# Altium footprint library TH_Connectors.PcbLib: 84 footprints (part 3 of 6)
Each footprint in its own frame and in the unit in brackets; x right, y up, seen from the top. Pads: shape width x height; smd on the part's side, far side on the other; paste and mask are expansions set on the pad; w line width, h text height; cw(c..) or ccw(c..) is an arc to the next point about the centre after c.
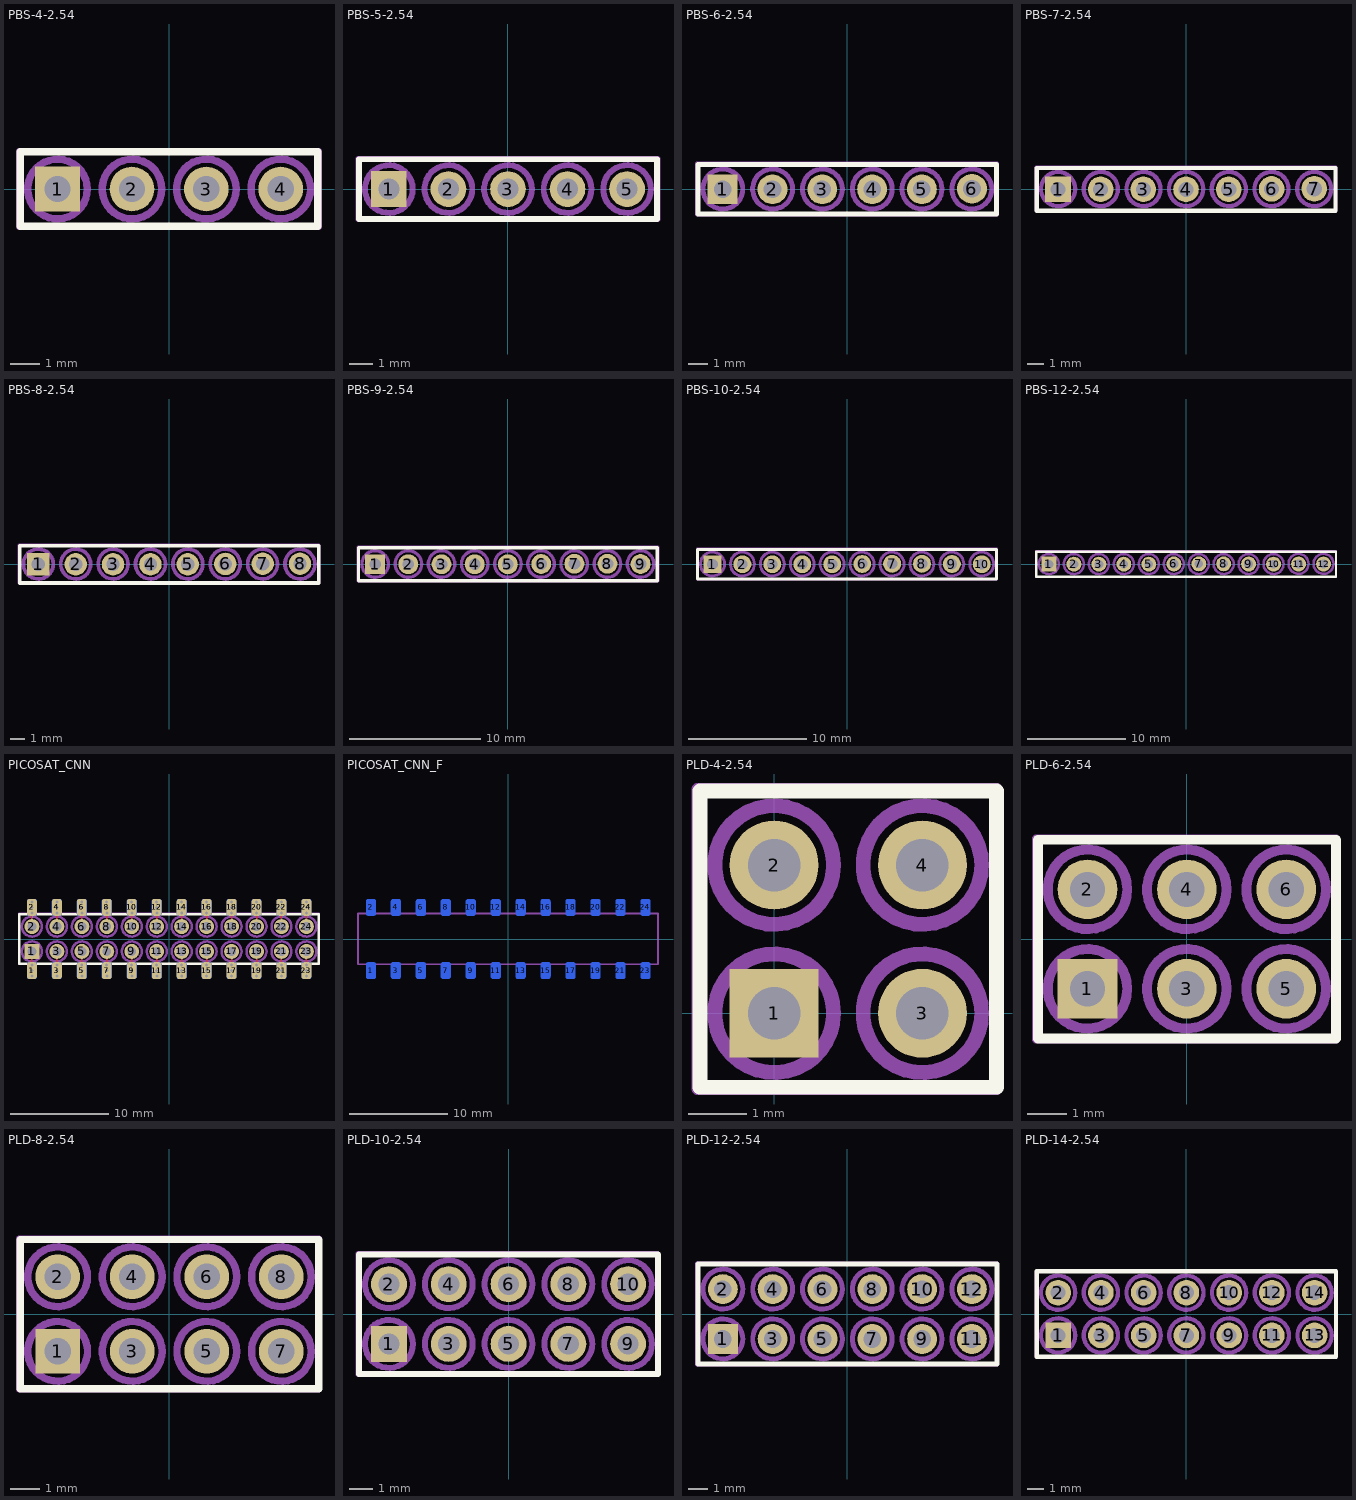
[diagram p2: the footprints below, top view; thin cyan lines are the x and y axes]

## PBS-4-2.54 [mil]
pads (4):
  rect 60x60 hole 35.43: 1(-150,0)
  round 60 hole 35.43: 2(-50,0) 3(50,0) 4(150,0)
Top Overlay:
  lines w10: -200,-50 -200,50 200,50 200,-50 -200,-50
Top Assembly:
  lines w7.87: -201.81,-51.12 -201.81,51.25 201.47,51.25 201.47,-51.12 -201.81,-51.12
Bottom Assembly:
  circle w10: c150,0 r40.05
  circle w10: c50,0 r40.05
  circle w10: c-50,0 r40.05
  circle w10: c-150,0 r40.05
3D body "User Library-PBS-01.STEP": height 330.71, standoff -125.98, extent 100,-50 200,50
3D body "User Library-PBS-01.STEP": height 330.71, standoff -125.98, extent 0,-50 100,50
3D body "User Library-PBS-01.STEP": height 330.71, standoff -125.98, extent -100,-50 0,50
3D body "User Library-PBS-01.STEP": height 330.71, standoff -125.98, extent -200,-50 -100,50

## PBS-5-2.54 [mil]
pads (5):
  rect 60x60 hole 35.43: 1(-200,0)
  round 60 hole 35.43: 2(-100,0) 3(0,0) 4(100,0) 5(200,0)
Top Overlay:
  lines w10: -250,-50 -250,50 250,50 250,-50 -250,-50
Top Assembly:
  lines w7.87: -251.81,-51.12 -251.81,51.25 251.9,51.25 251.9,-51.12 -251.81,-51.12
Bottom Assembly:
  circle w10: c0,0 r40.05
  circle w10: c200,0 r40.05
  circle w10: c100,0 r40.05
  circle w10: c-100,0 r40.05
  circle w10: c-200,0 r40.05
3D body "User Library-PBS-01.STEP": height 330.71, standoff -125.98, extent -250,-50 -150,50
3D body "User Library-PBS-01.STEP": height 330.71, standoff -125.98, extent -150,-49.99 -50,50.01
3D body "User Library-PBS-01.STEP": height 330.71, standoff -125.98, extent -50,-50 50,50
3D body "User Library-PBS-01.STEP": height 330.71, standoff -125.98, extent 50,-50 150,50
3D body "User Library-PBS-01.STEP": height 330.71, standoff -125.98, extent 150,-50 250,50

## PBS-6-2.54 [mil]
pads (6):
  rect 60x60 hole 35.43: 1(-250.24,-0.52)
  round 60 hole 35.43: 2(-150.24,-0.52) 3(-50.24,-0.52) 4(49.76,-0.52) 5(149.76,-0.52) 6(250.24,0.52)
Top Overlay:
  lines w10: -300.24,-50.52 299.76,-50.52 299.76,49.48 -300.24,49.48 -300.24,-50.52
Top Assembly:
  lines w7.87: -301.81,-51.12 -301.81,51.25 300.53,51.25 300.53,-51.12 -301.81,-51.12
Bottom Assembly:
  circle w10: c250,0 r40.05
  circle w10: c150,0 r40.05
  circle w10: c50,0 r40.05
  circle w10: c-50,0 r40.05
  circle w10: c-150,0 r40.05
  circle w10: c-250,0 r40.05
3D body "User Library-PBS-01.STEP": height 330.71, standoff -125.98, extent 200.25,-49.48 300.25,50.52
3D body "User Library-PBS-01.STEP": height 330.71, standoff -125.98, extent 99.76,-50.51 199.76,49.49
3D body "User Library-PBS-01.STEP": height 330.71, standoff -125.98, extent -0.24,-50.51 99.76,49.49
3D body "User Library-PBS-01.STEP": height 330.71, standoff -125.98, extent -100.24,-50.51 -0.24,49.49
3D body "User Library-PBS-01.STEP": height 330.71, standoff -125.98, extent -200.24,-50.51 -100.24,49.49
3D body "User Library-PBS-01.STEP": height 330.71, standoff -125.98, extent -300.24,-50.51 -200.24,49.49

## PBS-7-2.54 [mil]
pads (7):
  rect 60x60 hole 35.43: 1(-300.24,-0.78)
  round 60 hole 35.43: 2(-200.24,-0.78) 3(-100.24,-0.78) 4(-0.24,-0.78) 5(99.76,-0.78) 6(200.24,0.26) 7(300.24,0.78)
Top Overlay:
  lines w10: -350.24,-50.78 350,-50.78 350,49.22 -350.24,49.22 -350.24,-50.78
Top Assembly:
  lines w7.87: -351.81,-51.12 351.17,-51.12 351.17,51.25 -351.81,51.25 -351.81,-51.12
Bottom Assembly:
  circle w10: c-300,0 r40.05
  circle w10: c-200,0 r40.05
  circle w10: c-100,0 r40.05
  circle w10: c0,0 r40.05
  circle w10: c100,0 r40.05
  circle w10: c200,0 r40.05
  circle w10: c300,0 r40.05
3D body "User Library-PBS-01.STEP": height 330.71, standoff -125.98, extent -350.24,-50.77 -250.24,49.23
3D body "User Library-PBS-01.STEP": height 330.71, standoff -125.98, extent -250.24,-50.77 -150.24,49.23
3D body "User Library-PBS-01.STEP": height 330.71, standoff -125.98, extent -150.24,-50.77 -50.24,49.23
3D body "User Library-PBS-01.STEP": height 330.71, standoff -125.98, extent -50.24,-50.77 49.76,49.23
3D body "User Library-PBS-01.STEP": height 330.71, standoff -125.98, extent 49.76,-50.77 149.76,49.23
3D body "User Library-PBS-01.STEP": height 330.71, standoff -125.98, extent 150.25,-49.74 250.25,50.26
3D body "User Library-PBS-01.STEP": height 330.71, standoff -125.98, extent 250.25,-49.22 350.25,50.78

## PBS-8-2.54 [mil]
pads (8):
  rect 60x60 hole 35.43: 1(-350.12,-0.78)
  round 60 hole 35.43: 2(-250.12,-0.78) 3(-150.12,-0.78) 4(-50.12,-0.78) 5(49.88,-0.78) 6(150.36,0.26) 7(250.36,0.78) 8(350.12,0.78)
Top Overlay:
  lines w10: -400.12,-50.78 400.12,-50.78 400.12,49.22 -400.12,49.22 -400.12,-50.78
Top Assembly:
  lines w7.87: -401.81,-51.12 400.94,-51.12 400.94,51.25 -401.81,51.25 -401.81,-51.12
Bottom Assembly:
  circle w10: c-350,0 r40.05
  circle w10: c-250,0 r40.05
  circle w10: c-150,0 r40.05
  circle w10: c-50,0 r40.05
  circle w10: c50,0 r40.05
  circle w10: c150,0 r40.05
  circle w10: c250,0 r40.05
  circle w10: c350,0 r40.05
3D body "User Library-PBS-01.STEP": height 330.71, standoff -125.98, extent 300.12,-49.22 400.12,50.78
3D body "User Library-PBS-01.STEP": height 330.71, standoff -125.98, extent 200.37,-49.22 300.37,50.78
3D body "User Library-PBS-01.STEP": height 330.71, standoff -125.98, extent 100.37,-49.74 200.37,50.26
3D body "User Library-PBS-01.STEP": height 330.71, standoff -125.98, extent -0.12,-50.77 99.88,49.23
3D body "User Library-PBS-01.STEP": height 330.71, standoff -125.98, extent -100.12,-50.77 -0.12,49.23
3D body "User Library-PBS-01.STEP": height 330.71, standoff -125.98, extent -200.12,-50.77 -100.12,49.23
3D body "User Library-PBS-01.STEP": height 330.71, standoff -125.98, extent -300.12,-50.77 -200.12,49.23
3D body "User Library-PBS-01.STEP": height 330.71, standoff -125.98, extent -400.12,-50.77 -300.12,49.23

## PBS-9-2.54 [mil]
pads (9):
  rect 60x60 hole 35.43: 1(-400.06,-0.78)
  round 60 hole 35.43: 2(-300.06,-0.78) 3(-200.06,-0.78) 4(-100.06,-0.78) 5(-0.06,-0.78) 6(100.43,0.26) 7(200.43,0.78) 8(300.18,0.78) 9(400.06,0)
Top Overlay:
  lines w10: -450.06,-50.78 -450.06,49.22 450.06,49.22 450.06,-50.78 -450.06,-50.78
Top Assembly:
  lines w7.87: -451.81,-51.12 -451.81,51.25 452.47,51.25 452.47,-51.12 -451.81,-51.12
Bottom Assembly:
  circle w10: c400,0 r40.05
  circle w10: c300,0 r40.05
  circle w10: c200,0 r40.05
  circle w10: c100,0 r40.05
  circle w10: c0,0 r40.05
  circle w10: c-100,0 r40.05
  circle w10: c-200,0 r40.05
  circle w10: c-300,0 r40.05
  circle w10: c-400,0 r40.05
3D body "User Library-PBS-01.STEP": height 330.71, standoff -125.98, extent 350.06,-50 450.06,50
3D body "User Library-PBS-01.STEP": height 330.71, standoff -125.98, extent 250.19,-49.22 350.19,50.78
3D body "User Library-PBS-01.STEP": height 330.71, standoff -125.98, extent 150.43,-49.22 250.43,50.78
3D body "User Library-PBS-01.STEP": height 330.71, standoff -125.98, extent 50.43,-49.74 150.43,50.26
3D body "User Library-PBS-01.STEP": height 330.71, standoff -125.98, extent -50.06,-50.77 49.94,49.23
3D body "User Library-PBS-01.STEP": height 330.71, standoff -125.98, extent -150.06,-50.77 -50.06,49.23
3D body "User Library-PBS-01.STEP": height 330.71, standoff -125.98, extent -250.06,-50.77 -150.06,49.23
3D body "User Library-PBS-01.STEP": height 330.71, standoff -125.98, extent -350.06,-50.77 -250.06,49.23
3D body "User Library-PBS-01.STEP": height 330.71, standoff -125.98, extent -450.06,-50.77 -350.06,49.23

## PBS-10-2.54 [mil]
pads (10):
  rect 60x60 hole 35.43: 1(-450.03,-0.78)
  round 60 hole 35.43: 2(-350.03,-0.78) 3(-250.03,-0.78) 4(-150.03,-0.78) 5(-50.03,-0.78) 6(50.46,0.26) 7(150.46,0.78) 8(250.21,0.78) 9(350.09,0) 10(450.03,-0.78)
Top Overlay:
  lines w10: -500.03,-50.78 500.03,-50.78 500.03,49.22 -500.03,49.22 -500.03,-50.78
Top Assembly:
  lines w7.87: -501.81,-51.12 -501.81,51.25 500.93,51.25 500.93,-51.12 -501.81,-51.12
Bottom Assembly:
  circle w10: c450,0 r40.05
  circle w10: c350,0 r40.05
  circle w10: c250,0 r40.05
  circle w10: c150,0 r40.05
  circle w10: c50,0 r40.05
  circle w10: c-50,0 r40.05
  circle w10: c-150,0 r40.05
  circle w10: c-250,0 r40.05
  circle w10: c-350,0 r40.05
  circle w10: c-450,0 r40.05
3D body "User Library-PBS-01.STEP": height 330.71, standoff -125.98, extent 400.04,-50.77 500.04,49.23
3D body "User Library-PBS-01.STEP": height 330.71, standoff -125.98, extent 300.09,-50 400.09,50
3D body "User Library-PBS-01.STEP": height 330.71, standoff -125.98, extent 200.21,-49.22 300.21,50.78
3D body "User Library-PBS-01.STEP": height 330.71, standoff -125.98, extent 100.46,-49.22 200.46,50.78
3D body "User Library-PBS-01.STEP": height 330.71, standoff -125.98, extent 0.46,-49.74 100.46,50.26
3D body "User Library-PBS-01.STEP": height 330.71, standoff -125.98, extent -100.03,-50.77 -0.03,49.23
3D body "User Library-PBS-01.STEP": height 330.71, standoff -125.98, extent -200.03,-50.77 -100.03,49.23
3D body "User Library-PBS-01.STEP": height 330.71, standoff -125.98, extent -300.03,-50.77 -200.03,49.23
3D body "User Library-PBS-01.STEP": height 330.71, standoff -125.98, extent -400.03,-50.77 -300.03,49.23
3D body "User Library-PBS-01.STEP": height 330.71, standoff -125.98, extent -500.03,-50.77 -400.03,49.23

## PBS-12-2.54 [mil]
pads (12):
  rect 60x60 hole 35.43: 1(-550.02,-0.78)
  round 60 hole 35.43: 2(-450.02,-0.78) 3(-350.02,-0.78) 4(-250.02,-0.78) 5(-150.02,-0.78) 6(-49.53,0.26) 7(50.47,0.78) 8(150.23,0.78) 9(250.11,0) 10(350.05,-0.78) 11(450.02,0) 12(550.02,0)
Top Overlay:
  lines w10: -600.02,-50.78 600.02,-50.78 600.02,49.22 -600.02,49.22 -600.02,-50.78
Top Assembly:
  lines w7.87: -601.8,-51.12 -601.8,51.25 600.02,51.25 600.02,-51.12 -601.8,-51.12
Bottom Assembly:
  circle w10: c549.98,0.78 r40.05
  circle w10: c449.98,0.78 r40.05
  circle w10: c350.02,0 r40.05
  circle w10: c250.02,0 r40.05
  circle w10: c150.02,0 r40.05
  circle w10: c50.02,0 r40.05
  circle w10: c-49.98,0 r40.05
  circle w10: c-149.98,0 r40.05
  circle w10: c-249.98,0 r40.05
  circle w10: c-349.98,0 r40.05
  circle w10: c-449.98,0 r40.05
  circle w10: c-549.98,0 r40.05
3D body "User Library-PBS-01.STEP": height 330.71, standoff -125.98, extent 500.02,-50 600.02,50
3D body "User Library-PBS-01.STEP": height 330.71, standoff -125.98, extent 400.02,-50 500.02,50
3D body "User Library-PBS-01.STEP": height 330.71, standoff -125.98, extent 300.05,-50.77 400.05,49.23
3D body "User Library-PBS-01.STEP": height 330.71, standoff -125.98, extent 200.11,-50 300.11,50
3D body "User Library-PBS-01.STEP": height 330.71, standoff -125.98, extent 100.23,-49.22 200.23,50.78
3D body "User Library-PBS-01.STEP": height 330.71, standoff -125.98, extent 0.47,-49.22 100.47,50.78
3D body "User Library-PBS-01.STEP": height 330.71, standoff -125.98, extent -99.53,-49.74 0.47,50.26
3D body "User Library-PBS-01.STEP": height 330.71, standoff -125.98, extent -200.01,-50.77 -100.01,49.23
3D body "User Library-PBS-01.STEP": height 330.71, standoff -125.98, extent -300.01,-50.77 -200.01,49.23
3D body "User Library-PBS-01.STEP": height 330.71, standoff -125.98, extent -400.01,-50.77 -300.01,49.23
3D body "User Library-PBS-01.STEP": height 330.71, standoff -125.98, extent -500.01,-50.77 -400.01,49.23
3D body "User Library-PBS-01.STEP": height 330.71, standoff -125.98, extent -600.01,-50.77 -500.01,49.23

## PICOSAT_CNN [mil]
pads (72):
  rrect50% 39.37x66.93 smd: 1(-550,-126.57) 2(-550,126.57) 3(-450,-126.57) 4(-450,126.57) 5(-350,-126.57) 6(-350,126.57) 7(-250,-126.57) 8(-250,126.57) 9(-150,-126.57) 10(-150,126.57) 11(-50,-126.57) 12(-50,126.57) 13(50,-126.57) 14(50,126.57) 15(150,-126.57) 16(150,126.57) 17(250,-126.57) 18(250,126.57) 19(350,-126.57) 20(350,126.57) 21(450,-126.57) 22(450,126.57) 23(550,-126.57) 24(550,126.57)
  rrect50% 39.37x66.93 smd far side: 1(-550,-126.57) 2(-550,126.57) 3(-450,-126.57) 4(-450,126.57) 5(-350,-126.57) 6(-350,126.57) 7(-250,-126.57) 8(-250,126.57) 9(-150,-126.57) 10(-150,126.57) 11(-50,-126.57) 12(-50,126.57) 13(50,-126.57) 14(50,126.57) 15(150,-126.57) 16(150,126.57) 17(250,-126.57) 18(250,126.57) 19(350,-126.57) 20(350,126.57) 21(450,-126.57) 22(450,126.57) 23(550,-126.57) 24(550,126.57)
  rect 60x60 hole 35.43: 1(-550,-50)
  round 60 hole 35.43: 2(-550,50) 3(-450,-50) 4(-450,50) 5(-350,-50) 6(-350,50) 7(-250,-50) 8(-250,50) 9(-150,-50) 10(-150,50) 11(-50,-50) 12(-50,50) 13(50,-50) 14(50,50) 15(150,-50) 16(150,50) 17(250,-50) 18(250,50) 19(350,-50) 20(350,50) 21(450,-50) 22(450,50) 23(550,-50) 24(550,50)
via -550.4,-104.75 diameter 23.62 hole 11.81
via -550,-126.57 diameter 23.62 hole 11.81
via -549.6,-148.4 diameter 23.62 hole 11.81
via -450.4,-104.75 diameter 23.62 hole 11.81
via -450,-126.57 diameter 23.62 hole 11.81
via -449.6,-148.4 diameter 23.62 hole 11.81
via -350.4,-104.75 diameter 23.62 hole 11.81
via -350,-126.57 diameter 23.62 hole 11.81
via -349.6,-148.4 diameter 23.62 hole 11.81
via -250.4,-104.75 diameter 23.62 hole 11.81
via -250,-126.57 diameter 23.62 hole 11.81
via -249.6,-148.4 diameter 23.62 hole 11.81
via -150.4,-104.75 diameter 23.62 hole 11.81
via -150,-126.57 diameter 23.62 hole 11.81
via -149.6,-148.4 diameter 23.62 hole 11.81
via -50.4,-104.75 diameter 23.62 hole 11.81
via -50,-126.57 diameter 23.62 hole 11.81
via -49.6,-148.4 diameter 23.62 hole 11.81
via 49.6,-104.75 diameter 23.62 hole 11.81
via 50,-126.57 diameter 23.62 hole 11.81
via 50.4,-148.4 diameter 23.62 hole 11.81
via 149.6,-104.75 diameter 23.62 hole 11.81
via 150,-126.57 diameter 23.62 hole 11.81
via 150.4,-148.4 diameter 23.62 hole 11.81
via 249.6,-104.75 diameter 23.62 hole 11.81
via 250,-126.57 diameter 23.62 hole 11.81
via 250.4,-148.4 diameter 23.62 hole 11.81
via 349.6,-104.75 diameter 23.62 hole 11.81
via 350,-126.57 diameter 23.62 hole 11.81
via 350.4,-148.4 diameter 23.62 hole 11.81
via 449.6,-104.75 diameter 23.62 hole 11.81
via 450,-126.57 diameter 23.62 hole 11.81
via 450.4,-148.4 diameter 23.62 hole 11.81
via 549.6,-104.75 diameter 23.62 hole 11.81
via 550,-126.57 diameter 23.62 hole 11.81
via 550.4,-148.4 diameter 23.62 hole 11.81
via 550.41,104.75 diameter 23.62 hole 11.81
via 550.01,126.57 diameter 23.62 hole 11.81
via 549.61,148.4 diameter 23.62 hole 11.81
via 450.41,104.75 diameter 23.62 hole 11.81
via 450.01,126.57 diameter 23.62 hole 11.81
via 449.61,148.4 diameter 23.62 hole 11.81
via 350.41,104.75 diameter 23.62 hole 11.81
via 350.01,126.57 diameter 23.62 hole 11.81
via 349.61,148.4 diameter 23.62 hole 11.81
via 250.41,104.75 diameter 23.62 hole 11.81
via 250.01,126.57 diameter 23.62 hole 11.81
via 249.61,148.4 diameter 23.62 hole 11.81
via 150.41,104.75 diameter 23.62 hole 11.81
via 150.01,126.57 diameter 23.62 hole 11.81
via 149.61,148.4 diameter 23.62 hole 11.81
via 50.41,104.75 diameter 23.62 hole 11.81
via 50.01,126.57 diameter 23.62 hole 11.81
via 49.61,148.4 diameter 23.62 hole 11.81
via -49.59,104.75 diameter 23.62 hole 11.81
via -49.99,126.57 diameter 23.62 hole 11.81
via -50.39,148.4 diameter 23.62 hole 11.81
via -149.59,104.75 diameter 23.62 hole 11.81
via -149.99,126.57 diameter 23.62 hole 11.81
via -150.39,148.4 diameter 23.62 hole 11.81
via -249.59,104.75 diameter 23.62 hole 11.81
via -249.99,126.57 diameter 23.62 hole 11.81
via -250.39,148.4 diameter 23.62 hole 11.81
via -349.59,104.75 diameter 23.62 hole 11.81
via -349.99,126.57 diameter 23.62 hole 11.81
via -350.39,148.4 diameter 23.62 hole 11.81
via -449.59,104.75 diameter 23.62 hole 11.81
via -449.99,126.57 diameter 23.62 hole 11.81
via -450.39,148.4 diameter 23.62 hole 11.81
via -549.59,104.75 diameter 23.62 hole 11.81
via -549.99,126.57 diameter 23.62 hole 11.81
via -550.39,148.4 diameter 23.62 hole 11.81
Top Layer:
  lines w6: -550,-104.75 -550,-50 ; -550,50 -550,104.75 ; -450,-104.75 -450,-50 ; -450,50 -450,104.75 ; -350,-104.75 -350,-50 ; -350,50 -350,104.75 ; -250,-104.75 -250,-50 ; -250,50 -250,104.75 ; -150,-104.75 -150,-50 ; -150,50 -150,104.75 ; -50,-104.75 -50,-50 ; -50,50 -50,104.75 ; 50,-104.75 50,-50 ; 50,50 50,104.75 ; 150,-104.75 150,-50 ; 150,50 150,104.75 ; 250,-104.75 250,-50 ; 250,50 250,104.75 ; 350,-104.75 350,-50 ; 350,50 350,104.75 ; 450,-104.75 450,-50 ; 450,50 450,104.75 ; 550,-104.75 550,-50 ; 550,50 550,104.75
Bottom Layer:
  lines w6: -550,-104.75 -550,-50 ; -549.59,50 -549.59,104.75 ; -450,-104.75 -450,-50 ; -449.59,50 -449.59,104.75 ; -350,-104.75 -350,-50 ; -349.59,50 -349.59,104.75 ; -250,-104.75 -250,-50 ; -249.59,50 -249.59,104.75 ; -150,-104.75 -150,-50 ; -149.59,50 -149.59,104.75 ; -50,-104.75 -50,-50 ; -49.59,50 -49.59,104.75 ; 50,-104.75 50,-50 ; 50.41,50 50.41,104.75 ; 150,-104.75 150,-50 ; 150.41,50 150.41,104.75 ; 250,-104.75 250,-50 ; 250.41,50 250.41,104.75 ; 350,-104.75 350,-50 ; 350.41,50 350.41,104.75 ; 450,-104.75 450,-50 ; 450.41,50 450.41,104.75 ; 550,-104.75 550,-50 ; 550.41,50 550.41,104.75
  lines w7.87: -550,50 -549.59,50
Top Overlay:
  lines w10: -600,-100 0,-100 600,-100 600,100 0,100 -600,100 -600,-100
Top Assembly:
  lines w7.87: -1.81,-101.12 600.4,-101.12 600.4,101.31 -1.81,101.31 ; 0.4,-101.12 -601.81,-101.12 -601.81,101.31 0.4,101.31
Bottom Assembly:
  circle w10: c50,-50 r40.05
  circle w10: c50,50 r40.05
  circle w10: c150,-50 r40.05
  circle w10: c150,50 r40.05
  circle w10: c250,-50 r40.05
  circle w10: c250,50 r40.05
  circle w10: c350,-50 r40.05
  circle w10: c350,50 r40.05
  circle w10: c450,-50 r40.05
  circle w10: c450,50 r40.05
  circle w10: c550,-50 r40.05
  circle w10: c550,50 r40.05
  circle w10: c-550,-50 r40.05
  circle w10: c-550,50 r40.05
  circle w10: c-450,-50 r40.05
  circle w10: c-450,50 r40.05
  circle w10: c-350,-50 r40.05
  circle w10: c-350,50 r40.05
  circle w10: c-250,-50 r40.05
  circle w10: c-250,50 r40.05
  circle w10: c-150,-50 r40.05
  circle w10: c-150,50 r40.05
  circle w10: c-50,-50 r40.05
  circle w10: c-50,50 r40.05
3D body "pin_header_a-sl254-dg-g04mp1.stp": height 385.96, standoff 2.36, extent 0,-147.64 200,147.64
3D body "pin_header_a-sl254-dg-g04mp1.stp": height 385.96, standoff 2.36, extent -100,-147.64 100,147.64
3D body "pin_header_a-sl254-dg-g04mp1.stp": height 385.96, standoff 2.36, extent -200,-147.64 0,147.64
3D body "pin_header_a-sl254-dg-g04mp1.stp": height 385.96, standoff 2.36, extent -300,-147.64 -100,147.64
3D body "pin_header_a-sl254-dg-g04mp1.stp": height 385.96, standoff 2.36, extent -400,-147.64 -200,147.64
3D body "pin_header_a-sl254-dg-g04mp1.stp": height 385.96, standoff 2.36, extent -600,-147.64 -400,147.64
3D body "pin_header_a-sl254-dg-g04mp1.stp": height 385.96, standoff 2.36, extent 200,-147.64 400,147.64
3D body "pin_header_a-sl254-dg-g04mp1.stp": height 385.96, standoff 2.36, extent 400,-147.64 600,147.64
3D body "pcb_connector_803-87-024-30-001101.SLDPRT": height -15.74, standoff -354.37, extent -600,-135.83 600,135.83

## PICOSAT_CNN_F [mm]
pads (24):
  rrect50% 1x1.7 smd far side: 1(-13.97,-3.215) 2(-13.97,3.215) 3(-11.43,-3.215) 4(-11.43,3.215) 5(-8.89,-3.215) 6(-8.89,3.215) 7(-6.35,-3.215) 8(-6.35,3.215) 9(-3.81,-3.215) 10(-3.81,3.215) 11(-1.27,-3.215) 12(-1.27,3.215) 13(1.27,-3.215) 14(1.27,3.215) 15(3.81,-3.215) 16(3.81,3.215) 17(6.35,-3.215) 18(6.35,3.215) 19(8.89,-3.215) 20(8.89,3.215) 21(11.43,-3.215) 22(11.43,3.215) 23(13.97,-3.215) 24(13.97,3.215)
Top Assembly:
  lines w0.2: -0.046,-2.569 15.25,-2.569 15.25,2.573 -0.046,2.573 ; 0.01,-2.569 -15.286,-2.569 -15.286,2.573 0.01,2.573
3D body "pcb_connector_803-87-024-30-001101.SLDPRT": height -0.4, standoff -9, extent -15.24,-3.45 15.24,3.45

## PLD-4-2.54 [mil]
pads (4):
  rect 60x60 hole 35.43: 1(0,0)
  round 60 hole 35.43: 2(0,100) 3(100,0) 4(100,100)
Top Overlay:
  lines w10: -50,-50 -50,150 150,150 150,-50 -50,-50
Top Assembly:
  lines w7.87: -51.81,-51.12 150.11,-51.12 150.11,151.31 -51.81,151.31 -51.81,-51.12
Bottom Assembly:
  circle w10: c100,100 r40.05
  circle w10: c0,100 r40.05
  circle w10: c100,0 r40.05
  circle w10: c0,0 r40.05
3D body "PLS1.stp": height 336.22, standoff -118.11, extent -50,50 50,150
3D body "PLS1.stp": height 336.22, standoff -118.11, extent 50,50 150,150
3D body "PLS1.stp": height 336.22, standoff -118.11, extent -50,-50 50,50
3D body "PLS1.stp": height 336.22, standoff -118.11, extent 50,-50 150,50

## PLD-6-2.54 [mil]
pads (6):
  rect 60x60 hole 35.43: 1(-100,-50)
  round 60 hole 35.43: 2(-100,50) 3(0,-50) 4(0,50) 5(100,-50) 6(100,50)
Top Overlay:
  lines w10: -150,-100 -150,100 150,100 150,-100 -150,-100
Top Assembly:
  lines w7.87: -151.81,-101.12 -151.81,101.31 150.11,101.31 150.11,-101.12 -151.81,-101.12
Bottom Assembly:
  circle w10: c-100,-50 r40.05
  circle w10: c-100,50 r40.05
  circle w10: c0,-50 r40.05
  circle w10: c0,50 r40.05
  circle w10: c100,-50 r40.05
  circle w10: c100,50 r40.05
3D body "PLS1.stp": height 336.22, standoff -118.11, extent -150,0 -50,100
3D body "PLS1.stp": height 336.22, standoff -118.11, extent -50,0 50,100
3D body "PLS1.stp": height 336.22, standoff -118.11, extent -150,-100 -50,0
3D body "PLS1.stp": height 336.22, standoff -118.11, extent -50,-100 50,0
3D body "PLS1.stp": height 336.22, standoff -118.11, extent 50,0 150,100
3D body "PLS1.stp": height 336.22, standoff -118.11, extent 50,-100 150,0

## PLD-8-2.54 [mil]
pads (8):
  rect 60x60 hole 35.43: 1(-150,-50)
  round 60 hole 35.43: 2(-150,50) 3(-50,-50) 4(-50,50) 5(50,-50) 6(50,50) 7(150,-50) 8(150,50)
Top Overlay:
  lines w10: -200,-100 -200,100 200,100 200,-100 -200,-100
Top Assembly:
  lines w7.87: -201.81,-101.12 -201.81,101.31 200.56,101.31 200.56,-101.12 -201.81,-101.12
Bottom Assembly:
  circle w10: c150,50 r40.05
  circle w10: c150,-50 r40.05
  circle w10: c50,50 r40.05
  circle w10: c50,-50 r40.05
  circle w10: c-50,50 r40.05
  circle w10: c-50,-50 r40.05
  circle w10: c-150,50 r40.05
  circle w10: c-150,-50 r40.05
3D body "PLS1.stp": height 336.22, standoff -118.11, extent 100,0 200,100
3D body "PLS1.stp": height 336.22, standoff -118.11, extent 100,-100 200,0
3D body "PLS1.stp": height 336.22, standoff -118.11, extent -200,0 -100,100
3D body "PLS1.stp": height 336.22, standoff -118.11, extent -100,0 0,100
3D body "PLS1.stp": height 336.22, standoff -118.11, extent -200,-100 -100,0
3D body "PLS1.stp": height 336.22, standoff -118.11, extent -100,-100 0,0
3D body "PLS1.stp": height 336.22, standoff -118.11, extent 0,0 100,100
3D body "PLS1.stp": height 336.22, standoff -118.11, extent 0,-100 100,0

## PLD-10-2.54 [mil]
pads (10):
  rect 60x60 hole 35.43: 1(-200,-50)
  round 60 hole 35.43: 2(-200,50) 3(-100,-50) 4(-100,50) 5(0,-50) 6(0,50) 7(100,-50) 8(100,50) 9(200,-50) 10(200,50)
Top Overlay:
  lines w10: -250,-100 250,-100 250,100 -250,100 -250,-100
Top Assembly:
  lines w7.87: -251.81,-101.12 249.27,-101.12 249.27,101.31 -251.81,101.31 -251.81,-101.12
Bottom Assembly:
  circle w10: c200,50 r40.05
  circle w10: c200,-50 r40.05
  circle w10: c100,50 r40.05
  circle w10: c100,-50 r40.05
  circle w10: c0,50 r40.05
  circle w10: c0,-50 r40.05
  circle w10: c-100,50 r40.05
  circle w10: c-100,-50 r40.05
  circle w10: c-200,50 r40.05
  circle w10: c-200,-50 r40.05
3D body "PLS1.stp": height 336.22, standoff -118.11, extent -50,-100 50,0
3D body "PLS1.stp": height 336.22, standoff -118.11, extent -50,0 50,100
3D body "PLS1.stp": height 336.22, standoff -118.11, extent -150,-100 -50,0
3D body "PLS1.stp": height 336.22, standoff -118.11, extent -250,-100 -150,0
3D body "PLS1.stp": height 336.22, standoff -118.11, extent -150,0 -50,100
3D body "PLS1.stp": height 336.22, standoff -118.11, extent -250,0 -150,100
3D body "PLS1.stp": height 336.22, standoff -118.11, extent 50,-100 150,0
3D body "PLS1.stp": height 336.22, standoff -118.11, extent 50,0 150,100
3D body "PLS1.stp": height 336.22, standoff -118.11, extent 150,-100 250,0
3D body "PLS1.stp": height 336.22, standoff -118.11, extent 150,0 250,100

## PLD-12-2.54 [mil]
pads (12):
  rect 60x60 hole 35.43: 1(-250,-50)
  round 60 hole 35.43: 2(-250,50) 3(-150,-50) 4(-150,50) 5(-50,-50) 6(-50,50) 7(50,-50) 8(50,50) 9(150,-50) 10(150,50) 11(250,-50) 12(250,50)
Top Overlay:
  lines w10: -300,-100 300,-100 300,100 -300,100 -300,-100
Top Assembly:
  lines w7.87: -301.81,-101.12 300.4,-101.12 300.4,101.31 -301.81,101.31 -301.81,-101.12
Bottom Assembly:
  circle w10: c-250,-50 r40.05
  circle w10: c-250,50 r40.05
  circle w10: c-150,-50 r40.05
  circle w10: c-150,50 r40.05
  circle w10: c-50,-50 r40.05
  circle w10: c-50,50 r40.05
  circle w10: c50,-50 r40.05
  circle w10: c50,50 r40.05
  circle w10: c150,-50 r40.05
  circle w10: c150,50 r40.05
  circle w10: c250,-50 r40.05
  circle w10: c250,50 r40.05
3D body "PLS1.stp": height 336.22, standoff -118.11, extent -100,-100 0,0
3D body "PLS1.stp": height 336.22, standoff -118.11, extent -100,0 0,100
3D body "PLS1.stp": height 336.22, standoff -118.11, extent -200,-100 -100,0
3D body "PLS1.stp": height 336.22, standoff -118.11, extent -300,-100 -200,0
3D body "PLS1.stp": height 336.22, standoff -118.11, extent -200,0 -100,100
3D body "PLS1.stp": height 336.22, standoff -118.11, extent -300,0 -200,100
3D body "PLS1.stp": height 336.22, standoff -118.11, extent 0,-100 100,0
3D body "PLS1.stp": height 336.22, standoff -118.11, extent 0,0 100,100
3D body "PLS1.stp": height 336.22, standoff -118.11, extent 100,-100 200,0
3D body "PLS1.stp": height 336.22, standoff -118.11, extent 100,0 200,100
3D body "PLS1.stp": height 336.22, standoff -118.11, extent 200,-100 300,0
3D body "PLS1.stp": height 336.22, standoff -118.11, extent 200,0 300,100

## PLD-14-2.54 [mil]
pads (14):
  rect 60x60 hole 35.43: 1(-300,-50)
  round 60 hole 35.43: 2(-300,50) 3(-200,-50) 4(-200,50) 5(-100,-50) 6(-100,50) 7(0,-50) 8(0,50) 9(100,-50) 10(100,50) 11(200,-50) 12(200,50) 13(300,-50) 14(300,50)
Top Overlay:
  lines w10: -350,-100 -350,100 350,100 350,-100 -350,-100
Top Assembly:
  lines w7.87: -351.81,-101.12 -351.81,101.31 349.94,101.31 349.94,-101.12 -351.81,-101.12
Bottom Assembly:
  circle w10: c300,50 r40.05
  circle w10: c300,-50 r40.05
  circle w10: c200,50 r40.05
  circle w10: c200,-50 r40.05
  circle w10: c100,50 r40.05
  circle w10: c100,-50 r40.05
  circle w10: c0,50 r40.05
  circle w10: c0,-50 r40.05
  circle w10: c-100,50 r40.05
  circle w10: c-100,-50 r40.05
  circle w10: c-200,50 r40.05
  circle w10: c-200,-50 r40.05
  circle w10: c-300,50 r40.05
  circle w10: c-300,-50 r40.05
3D body "PLS1.stp": height 336.22, standoff -118.11, extent 250,0 350,100
3D body "PLS1.stp": height 336.22, standoff -118.11, extent 250,-100 350,0
3D body "PLS1.stp": height 336.22, standoff -118.11, extent 150,0 250,100
3D body "PLS1.stp": height 336.22, standoff -118.11, extent 150,-100 250,0
3D body "PLS1.stp": height 336.22, standoff -118.11, extent 50,0 150,100
3D body "PLS1.stp": height 336.22, standoff -118.11, extent 50,-100 150,0
3D body "PLS1.stp": height 336.22, standoff -118.11, extent -50,0 50,100
3D body "PLS1.stp": height 336.22, standoff -118.11, extent -50,-100 50,0
3D body "PLS1.stp": height 336.22, standoff -118.11, extent -350,0 -250,100
3D body "PLS1.stp": height 336.22, standoff -118.11, extent -250,0 -150,100
3D body "PLS1.stp": height 336.22, standoff -118.11, extent -350,-100 -250,0
3D body "PLS1.stp": height 336.22, standoff -118.11, extent -250,-100 -150,0
3D body "PLS1.stp": height 336.22, standoff -118.11, extent -150,0 -50,100
3D body "PLS1.stp": height 336.22, standoff -118.11, extent -150,-100 -50,0